# Altium integrated library Weidmueller_OMNIMATE_Signal.IntLib: 2550 symbols (part 22 of 45) (continued)
## 1793150000_Single (continued)
OMNIMATE Signal - series BC/SC 3.81; PartNumber: 1793150000; Manufacturer: Weidmueller; Short_text_for_material: SC 3.81/04/90G 3.2SN BK BX; Side_termination_characteristic: closed side; Mounting_onto_the_PCB: Solder connection; Pitch_mm: 3.81 mm; Pitch_inch: 0.15 inch; No_of_poles: 4; Outgoing_elbow: 90°; Solder_pin_length_mm: 3.2 mm; Contact_surface: tinned; Insulating_material: PA GF; UL_94_flammability_rating: V-0; Rated_voltage_for_surge_voltage_class_pollution_degree_II_2: 320 V; Rated_current_min_no_of_poles_TU_20_deg_C: 17.5 A; Rated_voltage_use_group_B_UL_1059: 300 V; Rated_current_use_group_B_UL_1059: 10 A; PackageReference: SC_3_81_90G_04; Colour: Black; Packaging: Box; Qty: 50 PCS; Revision: V1; ComponentLink1Description: Manufacturer URL; ComponentLink1URL: http://www.weidmueller.com/; ComponentLink2Description: URL Link1; ComponentLink2URL: http://catalog.weidmueller.com/catalog/Start.do?localeId=en&ObjectID=1793150000
footprint SC_3_81_90G_04 (OMNIMATE Signal - Serie BC/SC 3.81  SC 3.81/04/90G 3.2)
part A pins: A1
part B pins: A2
part C pins: A3
part D pins: A4

## 1793180000
designator J?
OMNIMATE Signal - series BC/SC 3.81; PartNumber: 1793180000; Manufacturer: Weidmueller; Short_text_for_material: SC 3.81/08/90G 3.2SN BK BX; Side_termination_characteristic: closed side; Mounting_onto_the_PCB: Solder connection; Pitch_mm: 3.81 mm; Pitch_inch: 0.15 inch; No_of_poles: 8; Outgoing_elbow: 90°; Solder_pin_length_mm: 3.2 mm; Contact_surface: tinned; Insulating_material: PA GF; UL_94_flammability_rating: V-0; Rated_voltage_for_surge_voltage_class_pollution_degree_II_2: 320 V; Rated_current_min_no_of_poles_TU_20_deg_C: 17.5 A; Rated_voltage_use_group_B_UL_1059: 300 V; Rated_current_use_group_B_UL_1059: 10 A; PackageReference: SC_3_81_90G_08; Colour: Black; Packaging: Box; Qty: 50 PCS; Revision: V1; ComponentLink1Description: Manufacturer URL; ComponentLink1URL: http://www.weidmueller.com/; ComponentLink2Description: URL Link1; ComponentLink2URL: http://catalog.weidmueller.com/catalog/Start.do?localeId=en&ObjectID=1793180000
footprint SC_3_81_90G_08 (OMNIMATE Signal - Serie BC/SC 3.81  SC 3.81/08/90G 3.2)
pins: A1, A2, A3, A4, A5, A6, A7, A8

## 1793180000_Single
designator J?
OMNIMATE Signal - series BC/SC 3.81; PartNumber: 1793180000; Manufacturer: Weidmueller; Short_text_for_material: SC 3.81/08/90G 3.2SN BK BX; Side_termination_characteristic: closed side; Mounting_onto_the_PCB: Solder connection; Pitch_mm: 3.81 mm; Pitch_inch: 0.15 inch; No_of_poles: 8; Outgoing_elbow: 90°; Solder_pin_length_mm: 3.2 mm; Contact_surface: tinned; Insulating_material: PA GF; UL_94_flammability_rating: V-0; Rated_voltage_for_surge_voltage_class_pollution_degree_II_2: 320 V; Rated_current_min_no_of_poles_TU_20_deg_C: 17.5 A; Rated_voltage_use_group_B_UL_1059: 300 V; Rated_current_use_group_B_UL_1059: 10 A; PackageReference: SC_3_81_90G_08; Colour: Black; Packaging: Box; Qty: 50 PCS; Revision: V1; ComponentLink1Description: Manufacturer URL; ComponentLink1URL: http://www.weidmueller.com/; ComponentLink2Description: URL Link1; ComponentLink2URL: http://catalog.weidmueller.com/catalog/Start.do?localeId=en&ObjectID=1793180000
footprint SC_3_81_90G_08 (OMNIMATE Signal - Serie BC/SC 3.81  SC 3.81/08/90G 3.2)
part A pins: A1
part B pins: A2
part C pins: A3
part D pins: A4
part E pins: A5
part F pins: A6
part G pins: A7
part H pins: A8

## 1793330000
designator J?
OMNIMATE Signal - series BC/SC 3.81; PartNumber: 1793330000; Manufacturer: Weidmueller; Short_text_for_material: SC 3.81/02/90F 3.2SN BK BX; Side_termination_characteristic: Flange; Mounting_onto_the_PCB: Solder connection; Pitch_mm: 3.81 mm; Pitch_inch: 0.15 inch; No_of_poles: 2; Outgoing_elbow: 90°; Solder_pin_length_mm: 3.2 mm; Contact_surface: tinned; Insulating_material: PA GF; UL_94_flammability_rating: V-0; Rated_voltage_for_surge_voltage_class_pollution_degree_II_2: 320 V; Rated_current_min_no_of_poles_TU_20_deg_C: 17.5 A; Rated_voltage_use_group_B_UL_1059: 300 V; Rated_current_use_group_B_UL_1059: 10 A; PackageReference: SC_3_81_90F_02; Colour: Black; Packaging: Box; Qty: 50 PCS; Revision: V1; ComponentLink1Description: Manufacturer URL; ComponentLink1URL: http://www.weidmueller.com/; ComponentLink2Description: URL Link1; ComponentLink2URL: http://catalog.weidmueller.com/catalog/Start.do?localeId=en&ObjectID=1793330000
footprint SC_3_81_90F_02 (OMNIMATE Signal - Serie BC/SC 3.81  SC 3.81/02/90F 3.2)
pins: A1, A2

## 1793330000_Single
designator J?
OMNIMATE Signal - series BC/SC 3.81; PartNumber: 1793330000; Manufacturer: Weidmueller; Short_text_for_material: SC 3.81/02/90F 3.2SN BK BX; Side_termination_characteristic: Flange; Mounting_onto_the_PCB: Solder connection; Pitch_mm: 3.81 mm; Pitch_inch: 0.15 inch; No_of_poles: 2; Outgoing_elbow: 90°; Solder_pin_length_mm: 3.2 mm; Contact_surface: tinned; Insulating_material: PA GF; UL_94_flammability_rating: V-0; Rated_voltage_for_surge_voltage_class_pollution_degree_II_2: 320 V; Rated_current_min_no_of_poles_TU_20_deg_C: 17.5 A; Rated_voltage_use_group_B_UL_1059: 300 V; Rated_current_use_group_B_UL_1059: 10 A; PackageReference: SC_3_81_90F_02; Colour: Black; Packaging: Box; Qty: 50 PCS; Revision: V1; ComponentLink1Description: Manufacturer URL; ComponentLink1URL: http://www.weidmueller.com/; ComponentLink2Description: URL Link1; ComponentLink2URL: http://catalog.weidmueller.com/catalog/Start.do?localeId=en&ObjectID=1793330000
footprint SC_3_81_90F_02 (OMNIMATE Signal - Serie BC/SC 3.81  SC 3.81/02/90F 3.2)
part A pins: A1
part B pins: A2

## 1793340000
designator J?
OMNIMATE Signal - series BC/SC 3.81; PartNumber: 1793340000; Manufacturer: Weidmueller; Short_text_for_material: SC 3.81/03/90F 3.2SN BK BX; Side_termination_characteristic: Flange; Mounting_onto_the_PCB: Solder connection; Pitch_mm: 3.81 mm; Pitch_inch: 0.15 inch; No_of_poles: 3; Outgoing_elbow: 90°; Solder_pin_length_mm: 3.2 mm; Contact_surface: tinned; Insulating_material: PA GF; UL_94_flammability_rating: V-0; Rated_voltage_for_surge_voltage_class_pollution_degree_II_2: 320 V; Rated_current_min_no_of_poles_TU_20_deg_C: 17.5 A; Rated_voltage_use_group_B_UL_1059: 300 V; Rated_current_use_group_B_UL_1059: 10 A; PackageReference: SC_3_81_90F_03; Colour: Black; Packaging: Box; Qty: 50 PCS; Revision: V1; ComponentLink1Description: Manufacturer URL; ComponentLink1URL: http://www.weidmueller.com/; ComponentLink2Description: URL Link1; ComponentLink2URL: http://catalog.weidmueller.com/catalog/Start.do?localeId=en&ObjectID=1793340000
footprint SC_3_81_90F_03 (OMNIMATE Signal - Serie BC/SC 3.81  SC 3.81/03/90F 3.2)
pins: A1, A2, A3

## 1793340000_Single
designator J?
OMNIMATE Signal - series BC/SC 3.81; PartNumber: 1793340000; Manufacturer: Weidmueller; Short_text_for_material: SC 3.81/03/90F 3.2SN BK BX; Side_termination_characteristic: Flange; Mounting_onto_the_PCB: Solder connection; Pitch_mm: 3.81 mm; Pitch_inch: 0.15 inch; No_of_poles: 3; Outgoing_elbow: 90°; Solder_pin_length_mm: 3.2 mm; Contact_surface: tinned; Insulating_material: PA GF; UL_94_flammability_rating: V-0; Rated_voltage_for_surge_voltage_class_pollution_degree_II_2: 320 V; Rated_current_min_no_of_poles_TU_20_deg_C: 17.5 A; Rated_voltage_use_group_B_UL_1059: 300 V; Rated_current_use_group_B_UL_1059: 10 A; PackageReference: SC_3_81_90F_03; Colour: Black; Packaging: Box; Qty: 50 PCS; Revision: V1; ComponentLink1Description: Manufacturer URL; ComponentLink1URL: http://www.weidmueller.com/; ComponentLink2Description: URL Link1; ComponentLink2URL: http://catalog.weidmueller.com/catalog/Start.do?localeId=en&ObjectID=1793340000
footprint SC_3_81_90F_03 (OMNIMATE Signal - Serie BC/SC 3.81  SC 3.81/03/90F 3.2)
part A pins: A1
part B pins: A2
part C pins: A3

## 1793350000
designator J?
OMNIMATE Signal - series BC/SC 3.81; PartNumber: 1793350000; Manufacturer: Weidmueller; Short_text_for_material: SC 3.81/04/90F 3.2SN BK BX; Side_termination_characteristic: Flange; Mounting_onto_the_PCB: Solder connection; Pitch_mm: 3.81 mm; Pitch_inch: 0.15 inch; No_of_poles: 4; Outgoing_elbow: 90°; Solder_pin_length_mm: 3.2 mm; Contact_surface: tinned; Insulating_material: PA GF; UL_94_flammability_rating: V-0; Rated_voltage_for_surge_voltage_class_pollution_degree_II_2: 320 V; Rated_current_min_no_of_poles_TU_20_deg_C: 17.5 A; Rated_voltage_use_group_B_UL_1059: 300 V; Rated_current_use_group_B_UL_1059: 10 A; PackageReference: SC_3_81_90F_04; Colour: Black; Packaging: Box; Qty: 50 PCS; Revision: V1; ComponentLink1Description: Manufacturer URL; ComponentLink1URL: http://www.weidmueller.com/; ComponentLink2Description: URL Link1; ComponentLink2URL: http://catalog.weidmueller.com/catalog/Start.do?localeId=en&ObjectID=1793350000
footprint SC_3_81_90F_04 (OMNIMATE Signal - Serie BC/SC 3.81  SC 3.81/04/90F 3.2)
pins: A1, A2, A3, A4

## 1793350000_Single
designator J?
OMNIMATE Signal - series BC/SC 3.81; PartNumber: 1793350000; Manufacturer: Weidmueller; Short_text_for_material: SC 3.81/04/90F 3.2SN BK BX; Side_termination_characteristic: Flange; Mounting_onto_the_PCB: Solder connection; Pitch_mm: 3.81 mm; Pitch_inch: 0.15 inch; No_of_poles: 4; Outgoing_elbow: 90°; Solder_pin_length_mm: 3.2 mm; Contact_surface: tinned; Insulating_material: PA GF; UL_94_flammability_rating: V-0; Rated_voltage_for_surge_voltage_class_pollution_degree_II_2: 320 V; Rated_current_min_no_of_poles_TU_20_deg_C: 17.5 A; Rated_voltage_use_group_B_UL_1059: 300 V; Rated_current_use_group_B_UL_1059: 10 A; PackageReference: SC_3_81_90F_04; Colour: Black; Packaging: Box; Qty: 50 PCS; Revision: V1; ComponentLink1Description: Manufacturer URL; ComponentLink1URL: http://www.weidmueller.com/; ComponentLink2Description: URL Link1; ComponentLink2URL: http://catalog.weidmueller.com/catalog/Start.do?localeId=en&ObjectID=1793350000
footprint SC_3_81_90F_04 (OMNIMATE Signal - Serie BC/SC 3.81  SC 3.81/04/90F 3.2)
part A pins: A1
part B pins: A2
part C pins: A3
part D pins: A4

## 1793380000
designator J?
OMNIMATE Signal - series BC/SC 3.81; PartNumber: 1793380000; Manufacturer: Weidmueller; Short_text_for_material: SC 3.81/08/90F 3.2SN BK BX; Side_termination_characteristic: Flange; Mounting_onto_the_PCB: Solder connection; Pitch_mm: 3.81 mm; Pitch_inch: 0.15 inch; No_of_poles: 8; Outgoing_elbow: 90°; Solder_pin_length_mm: 3.2 mm; Contact_surface: tinned; Insulating_material: PA GF; UL_94_flammability_rating: V-0; Rated_voltage_for_surge_voltage_class_pollution_degree_II_2: 320 V; Rated_current_min_no_of_poles_TU_20_deg_C: 17.5 A; Rated_voltage_use_group_B_UL_1059: 300 V; Rated_current_use_group_B_UL_1059: 10 A; PackageReference: SC_3_81_90F_08; Colour: Black; Packaging: Box; Qty: 50 PCS; Revision: V1; ComponentLink1Description: Manufacturer URL; ComponentLink1URL: http://www.weidmueller.com/; ComponentLink2Description: URL Link1; ComponentLink2URL: http://catalog.weidmueller.com/catalog/Start.do?localeId=en&ObjectID=1793380000
footprint SC_3_81_90F_08 (OMNIMATE Signal - Serie BC/SC 3.81  SC 3.81/08/90F 3.2)
pins: A1, A2, A3, A4, A5, A6, A7, A8

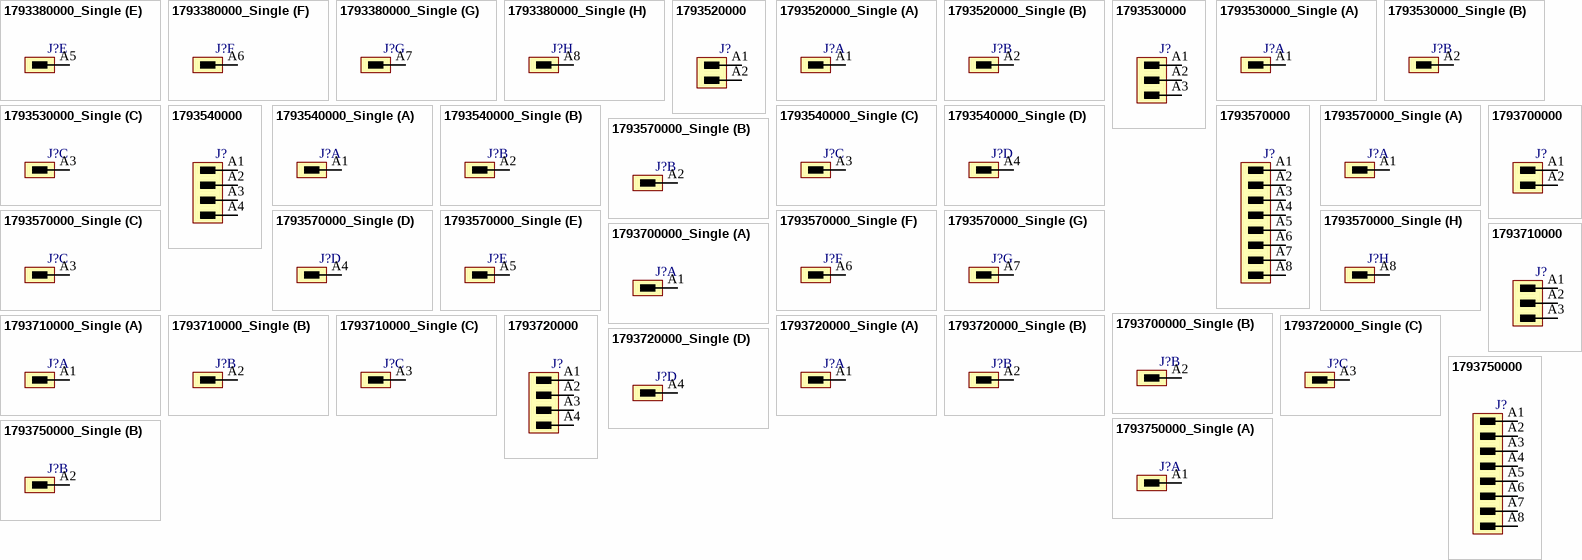
[diagram p120: symbols 1793380000_Single to 1793750000_Single]

## 1793380000_Single
designator J?
OMNIMATE Signal - series BC/SC 3.81; PartNumber: 1793380000; Manufacturer: Weidmueller; Short_text_for_material: SC 3.81/08/90F 3.2SN BK BX; Side_termination_characteristic: Flange; Mounting_onto_the_PCB: Solder connection; Pitch_mm: 3.81 mm; Pitch_inch: 0.15 inch; No_of_poles: 8; Outgoing_elbow: 90°; Solder_pin_length_mm: 3.2 mm; Contact_surface: tinned; Insulating_material: PA GF; UL_94_flammability_rating: V-0; Rated_voltage_for_surge_voltage_class_pollution_degree_II_2: 320 V; Rated_current_min_no_of_poles_TU_20_deg_C: 17.5 A; Rated_voltage_use_group_B_UL_1059: 300 V; Rated_current_use_group_B_UL_1059: 10 A; PackageReference: SC_3_81_90F_08; Colour: Black; Packaging: Box; Qty: 50 PCS; Revision: V1; ComponentLink1Description: Manufacturer URL; ComponentLink1URL: http://www.weidmueller.com/; ComponentLink2Description: URL Link1; ComponentLink2URL: http://catalog.weidmueller.com/catalog/Start.do?localeId=en&ObjectID=1793380000
footprint SC_3_81_90F_08 (OMNIMATE Signal - Serie BC/SC 3.81  SC 3.81/08/90F 3.2)
part A pins: A1
part B pins: A2
part C pins: A3
part D pins: A4
part E pins: A5
part F pins: A6
part G pins: A7
part H pins: A8

## 1793520000
designator J?
OMNIMATE Signal - series BC/SC 3.81; PartNumber: 1793520000; Manufacturer: Weidmueller; Short_text_for_material: SC 3.81/02/180G 3.2SN BK BX; Side_termination_characteristic: closed side; Mounting_onto_the_PCB: Solder connection; Pitch_mm: 3.81 mm; Pitch_inch: 0.15 inch; No_of_poles: 2; Outgoing_elbow: 180°; Solder_pin_length_mm: 3.2 mm; Contact_surface: tinned; Insulating_material: PA GF; UL_94_flammability_rating: V-0; Rated_voltage_for_surge_voltage_class_pollution_degree_II_2: 320 V; Rated_current_min_no_of_poles_TU_20_deg_C: 17.5 A; Rated_voltage_use_group_B_UL_1059: 300 V; Rated_current_use_group_B_UL_1059: 10 A; PackageReference: SC_3_81_180G_02; Colour: Black; Packaging: Box; Qty: 50 PCS; Revision: V1; ComponentLink1Description: Manufacturer URL; ComponentLink1URL: http://www.weidmueller.com/; ComponentLink2Description: URL Link1; ComponentLink2URL: http://catalog.weidmueller.com/catalog/Start.do?localeId=en&ObjectID=1793520000
footprint SC_3_81_180G_02 (OMNIMATE Signal - Serie BC/SC 3.81  SC 3.81/02/180G 3.2)
pins: A1, A2

## 1793520000_Single
designator J?
OMNIMATE Signal - series BC/SC 3.81; PartNumber: 1793520000; Manufacturer: Weidmueller; Short_text_for_material: SC 3.81/02/180G 3.2SN BK BX; Side_termination_characteristic: closed side; Mounting_onto_the_PCB: Solder connection; Pitch_mm: 3.81 mm; Pitch_inch: 0.15 inch; No_of_poles: 2; Outgoing_elbow: 180°; Solder_pin_length_mm: 3.2 mm; Contact_surface: tinned; Insulating_material: PA GF; UL_94_flammability_rating: V-0; Rated_voltage_for_surge_voltage_class_pollution_degree_II_2: 320 V; Rated_current_min_no_of_poles_TU_20_deg_C: 17.5 A; Rated_voltage_use_group_B_UL_1059: 300 V; Rated_current_use_group_B_UL_1059: 10 A; PackageReference: SC_3_81_180G_02; Colour: Black; Packaging: Box; Qty: 50 PCS; Revision: V1; ComponentLink1Description: Manufacturer URL; ComponentLink1URL: http://www.weidmueller.com/; ComponentLink2Description: URL Link1; ComponentLink2URL: http://catalog.weidmueller.com/catalog/Start.do?localeId=en&ObjectID=1793520000
footprint SC_3_81_180G_02 (OMNIMATE Signal - Serie BC/SC 3.81  SC 3.81/02/180G 3.2)
part A pins: A1
part B pins: A2

## 1793530000
designator J?
OMNIMATE Signal - series BC/SC 3.81; PartNumber: 1793530000; Manufacturer: Weidmueller; Short_text_for_material: SC 3.81/03/180G 3.2SN BK BX; Side_termination_characteristic: closed side; Mounting_onto_the_PCB: Solder connection; Pitch_mm: 3.81 mm; Pitch_inch: 0.15 inch; No_of_poles: 3; Outgoing_elbow: 180°; Solder_pin_length_mm: 3.2 mm; Contact_surface: tinned; Insulating_material: PA GF; UL_94_flammability_rating: V-0; Rated_voltage_for_surge_voltage_class_pollution_degree_II_2: 320 V; Rated_current_min_no_of_poles_TU_20_deg_C: 17.5 A; Rated_voltage_use_group_B_UL_1059: 300 V; Rated_current_use_group_B_UL_1059: 10 A; PackageReference: SC_3_81_180G_03; Colour: Black; Packaging: Box; Qty: 50 PCS; Revision: V1; ComponentLink1Description: Manufacturer URL; ComponentLink1URL: http://www.weidmueller.com/; ComponentLink2Description: URL Link1; ComponentLink2URL: http://catalog.weidmueller.com/catalog/Start.do?localeId=en&ObjectID=1793530000
footprint SC_3_81_180G_03 (OMNIMATE Signal - Serie BC/SC 3.81  SC 3.81/03/180G 3.2)
pins: A1, A2, A3

## 1793530000_Single
designator J?
OMNIMATE Signal - series BC/SC 3.81; PartNumber: 1793530000; Manufacturer: Weidmueller; Short_text_for_material: SC 3.81/03/180G 3.2SN BK BX; Side_termination_characteristic: closed side; Mounting_onto_the_PCB: Solder connection; Pitch_mm: 3.81 mm; Pitch_inch: 0.15 inch; No_of_poles: 3; Outgoing_elbow: 180°; Solder_pin_length_mm: 3.2 mm; Contact_surface: tinned; Insulating_material: PA GF; UL_94_flammability_rating: V-0; Rated_voltage_for_surge_voltage_class_pollution_degree_II_2: 320 V; Rated_current_min_no_of_poles_TU_20_deg_C: 17.5 A; Rated_voltage_use_group_B_UL_1059: 300 V; Rated_current_use_group_B_UL_1059: 10 A; PackageReference: SC_3_81_180G_03; Colour: Black; Packaging: Box; Qty: 50 PCS; Revision: V1; ComponentLink1Description: Manufacturer URL; ComponentLink1URL: http://www.weidmueller.com/; ComponentLink2Description: URL Link1; ComponentLink2URL: http://catalog.weidmueller.com/catalog/Start.do?localeId=en&ObjectID=1793530000
footprint SC_3_81_180G_03 (OMNIMATE Signal - Serie BC/SC 3.81  SC 3.81/03/180G 3.2)
part A pins: A1
part B pins: A2
part C pins: A3

## 1793540000
designator J?
OMNIMATE Signal - series BC/SC 3.81; PartNumber: 1793540000; Manufacturer: Weidmueller; Short_text_for_material: SC 3.81/04/180G 3.2SN BK BX; Side_termination_characteristic: closed side; Mounting_onto_the_PCB: Solder connection; Pitch_mm: 3.81 mm; Pitch_inch: 0.15 inch; No_of_poles: 4; Outgoing_elbow: 180°; Solder_pin_length_mm: 3.2 mm; Contact_surface: tinned; Insulating_material: PA GF; UL_94_flammability_rating: V-0; Rated_voltage_for_surge_voltage_class_pollution_degree_II_2: 320 V; Rated_current_min_no_of_poles_TU_20_deg_C: 17.5 A; Rated_voltage_use_group_B_UL_1059: 300 V; Rated_current_use_group_B_UL_1059: 10 A; PackageReference: SC_3_81_180G_04; Colour: Black; Packaging: Box; Qty: 50 PCS; Revision: V1; ComponentLink1Description: Manufacturer URL; ComponentLink1URL: http://www.weidmueller.com/; ComponentLink2Description: URL Link1; ComponentLink2URL: http://catalog.weidmueller.com/catalog/Start.do?localeId=en&ObjectID=1793540000
footprint SC_3_81_180G_04 (OMNIMATE Signal - Serie BC/SC 3.81  SC 3.81/04/180G 3.2)
pins: A1, A2, A3, A4

## 1793540000_Single
designator J?
OMNIMATE Signal - series BC/SC 3.81; PartNumber: 1793540000; Manufacturer: Weidmueller; Short_text_for_material: SC 3.81/04/180G 3.2SN BK BX; Side_termination_characteristic: closed side; Mounting_onto_the_PCB: Solder connection; Pitch_mm: 3.81 mm; Pitch_inch: 0.15 inch; No_of_poles: 4; Outgoing_elbow: 180°; Solder_pin_length_mm: 3.2 mm; Contact_surface: tinned; Insulating_material: PA GF; UL_94_flammability_rating: V-0; Rated_voltage_for_surge_voltage_class_pollution_degree_II_2: 320 V; Rated_current_min_no_of_poles_TU_20_deg_C: 17.5 A; Rated_voltage_use_group_B_UL_1059: 300 V; Rated_current_use_group_B_UL_1059: 10 A; PackageReference: SC_3_81_180G_04; Colour: Black; Packaging: Box; Qty: 50 PCS; Revision: V1; ComponentLink1Description: Manufacturer URL; ComponentLink1URL: http://www.weidmueller.com/; ComponentLink2Description: URL Link1; ComponentLink2URL: http://catalog.weidmueller.com/catalog/Start.do?localeId=en&ObjectID=1793540000
footprint SC_3_81_180G_04 (OMNIMATE Signal - Serie BC/SC 3.81  SC 3.81/04/180G 3.2)
part A pins: A1
part B pins: A2
part C pins: A3
part D pins: A4

## 1793570000
designator J?
OMNIMATE Signal - series BC/SC 3.81; PartNumber: 1793570000; Manufacturer: Weidmueller; Short_text_for_material: SC 3.81/08/180G 3.2SN BK BX; Side_termination_characteristic: closed side; Mounting_onto_the_PCB: Solder connection; Pitch_mm: 3.81 mm; Pitch_inch: 0.15 inch; No_of_poles: 8; Outgoing_elbow: 180°; Solder_pin_length_mm: 3.2 mm; Contact_surface: tinned; Insulating_material: PA GF; UL_94_flammability_rating: V-0; Rated_voltage_for_surge_voltage_class_pollution_degree_II_2: 320 V; Rated_current_min_no_of_poles_TU_20_deg_C: 17.5 A; Rated_voltage_use_group_B_UL_1059: 300 V; Rated_current_use_group_B_UL_1059: 10 A; PackageReference: SC_3_81_180G_08; Colour: Black; Packaging: Box; Qty: 50 PCS; Revision: V1; ComponentLink1Description: Manufacturer URL; ComponentLink1URL: http://www.weidmueller.com/; ComponentLink2Description: URL Link1; ComponentLink2URL: http://catalog.weidmueller.com/catalog/Start.do?localeId=en&ObjectID=1793570000
footprint SC_3_81_180G_08 (OMNIMATE Signal - Serie BC/SC 3.81  SC 3.81/08/180G 3.2)
pins: A1, A2, A3, A4, A5, A6, A7, A8

## 1793570000_Single
designator J?
OMNIMATE Signal - series BC/SC 3.81; PartNumber: 1793570000; Manufacturer: Weidmueller; Short_text_for_material: SC 3.81/08/180G 3.2SN BK BX; Side_termination_characteristic: closed side; Mounting_onto_the_PCB: Solder connection; Pitch_mm: 3.81 mm; Pitch_inch: 0.15 inch; No_of_poles: 8; Outgoing_elbow: 180°; Solder_pin_length_mm: 3.2 mm; Contact_surface: tinned; Insulating_material: PA GF; UL_94_flammability_rating: V-0; Rated_voltage_for_surge_voltage_class_pollution_degree_II_2: 320 V; Rated_current_min_no_of_poles_TU_20_deg_C: 17.5 A; Rated_voltage_use_group_B_UL_1059: 300 V; Rated_current_use_group_B_UL_1059: 10 A; PackageReference: SC_3_81_180G_08; Colour: Black; Packaging: Box; Qty: 50 PCS; Revision: V1; ComponentLink1Description: Manufacturer URL; ComponentLink1URL: http://www.weidmueller.com/; ComponentLink2Description: URL Link1; ComponentLink2URL: http://catalog.weidmueller.com/catalog/Start.do?localeId=en&ObjectID=1793570000
footprint SC_3_81_180G_08 (OMNIMATE Signal - Serie BC/SC 3.81  SC 3.81/08/180G 3.2)
part A pins: A1
part B pins: A2
part C pins: A3
part D pins: A4
part E pins: A5
part F pins: A6
part G pins: A7
part H pins: A8

## 1793700000
designator J?
OMNIMATE Signal - series BC/SC 3.81; PartNumber: 1793700000; Manufacturer: Weidmueller; Short_text_for_material: SC 3.81/02/180F 3.2SN BK BX; Side_termination_characteristic: Flange; Mounting_onto_the_PCB: Solder connection; Pitch_mm: 3.81 mm; Pitch_inch: 0.15 inch; No_of_poles: 2; Outgoing_elbow: 180°; Solder_pin_length_mm: 3.2 mm; Contact_surface: tinned; Insulating_material: PA GF; UL_94_flammability_rating: V-0; Rated_voltage_for_surge_voltage_class_pollution_degree_II_2: 320 V; Rated_current_min_no_of_poles_TU_20_deg_C: 17.5 A; Rated_voltage_use_group_B_UL_1059: 300 V; Rated_current_use_group_B_UL_1059: 10 A; PackageReference: SC_3_81_180F_02; Colour: Black; Packaging: Box; Qty: 50 PCS; Revision: V1; ComponentLink1Description: Manufacturer URL; ComponentLink1URL: http://www.weidmueller.com/; ComponentLink2Description: URL Link1; ComponentLink2URL: http://catalog.weidmueller.com/catalog/Start.do?localeId=en&ObjectID=1793700000
footprint SC_3_81_180F_02 (OMNIMATE Signal - Serie BC/SC 3.81  SC 3.81/02/180F 3.2)
pins: A1, A2

## 1793700000_Single
designator J?
OMNIMATE Signal - series BC/SC 3.81; PartNumber: 1793700000; Manufacturer: Weidmueller; Short_text_for_material: SC 3.81/02/180F 3.2SN BK BX; Side_termination_characteristic: Flange; Mounting_onto_the_PCB: Solder connection; Pitch_mm: 3.81 mm; Pitch_inch: 0.15 inch; No_of_poles: 2; Outgoing_elbow: 180°; Solder_pin_length_mm: 3.2 mm; Contact_surface: tinned; Insulating_material: PA GF; UL_94_flammability_rating: V-0; Rated_voltage_for_surge_voltage_class_pollution_degree_II_2: 320 V; Rated_current_min_no_of_poles_TU_20_deg_C: 17.5 A; Rated_voltage_use_group_B_UL_1059: 300 V; Rated_current_use_group_B_UL_1059: 10 A; PackageReference: SC_3_81_180F_02; Colour: Black; Packaging: Box; Qty: 50 PCS; Revision: V1; ComponentLink1Description: Manufacturer URL; ComponentLink1URL: http://www.weidmueller.com/; ComponentLink2Description: URL Link1; ComponentLink2URL: http://catalog.weidmueller.com/catalog/Start.do?localeId=en&ObjectID=1793700000
footprint SC_3_81_180F_02 (OMNIMATE Signal - Serie BC/SC 3.81  SC 3.81/02/180F 3.2)
part A pins: A1
part B pins: A2

## 1793710000
designator J?
OMNIMATE Signal - series BC/SC 3.81; PartNumber: 1793710000; Manufacturer: Weidmueller; Short_text_for_material: SC 3.81/03/180F 3.2SN BK BX; Side_termination_characteristic: Flange; Mounting_onto_the_PCB: Solder connection; Pitch_mm: 3.81 mm; Pitch_inch: 0.15 inch; No_of_poles: 3; Outgoing_elbow: 180°; Solder_pin_length_mm: 3.2 mm; Contact_surface: tinned; Insulating_material: PA GF; UL_94_flammability_rating: V-0; Rated_voltage_for_surge_voltage_class_pollution_degree_II_2: 320 V; Rated_current_min_no_of_poles_TU_20_deg_C: 17.5 A; Rated_voltage_use_group_B_UL_1059: 300 V; Rated_current_use_group_B_UL_1059: 10 A; PackageReference: SC_3_81_180F_03; Colour: Black; Packaging: Box; Qty: 50 PCS; Revision: V1; ComponentLink1Description: Manufacturer URL; ComponentLink1URL: http://www.weidmueller.com/; ComponentLink2Description: URL Link1; ComponentLink2URL: http://catalog.weidmueller.com/catalog/Start.do?localeId=en&ObjectID=1793710000
footprint SC_3_81_180F_03 (OMNIMATE Signal - Serie BC/SC 3.81  SC 3.81/03/180F 3.2)
pins: A1, A2, A3

## 1793710000_Single
designator J?
OMNIMATE Signal - series BC/SC 3.81; PartNumber: 1793710000; Manufacturer: Weidmueller; Short_text_for_material: SC 3.81/03/180F 3.2SN BK BX; Side_termination_characteristic: Flange; Mounting_onto_the_PCB: Solder connection; Pitch_mm: 3.81 mm; Pitch_inch: 0.15 inch; No_of_poles: 3; Outgoing_elbow: 180°; Solder_pin_length_mm: 3.2 mm; Contact_surface: tinned; Insulating_material: PA GF; UL_94_flammability_rating: V-0; Rated_voltage_for_surge_voltage_class_pollution_degree_II_2: 320 V; Rated_current_min_no_of_poles_TU_20_deg_C: 17.5 A; Rated_voltage_use_group_B_UL_1059: 300 V; Rated_current_use_group_B_UL_1059: 10 A; PackageReference: SC_3_81_180F_03; Colour: Black; Packaging: Box; Qty: 50 PCS; Revision: V1; ComponentLink1Description: Manufacturer URL; ComponentLink1URL: http://www.weidmueller.com/; ComponentLink2Description: URL Link1; ComponentLink2URL: http://catalog.weidmueller.com/catalog/Start.do?localeId=en&ObjectID=1793710000
footprint SC_3_81_180F_03 (OMNIMATE Signal - Serie BC/SC 3.81  SC 3.81/03/180F 3.2)
part A pins: A1
part B pins: A2
part C pins: A3

## 1793720000
designator J?
OMNIMATE Signal - series BC/SC 3.81; PartNumber: 1793720000; Manufacturer: Weidmueller; Short_text_for_material: SC 3.81/04/180F 3.2SN BK BX; Side_termination_characteristic: Flange; Mounting_onto_the_PCB: Solder connection; Pitch_mm: 3.81 mm; Pitch_inch: 0.15 inch; No_of_poles: 4; Outgoing_elbow: 180°; Solder_pin_length_mm: 3.2 mm; Contact_surface: tinned; Insulating_material: PA GF; UL_94_flammability_rating: V-0; Rated_voltage_for_surge_voltage_class_pollution_degree_II_2: 320 V; Rated_current_min_no_of_poles_TU_20_deg_C: 17.5 A; Rated_voltage_use_group_B_UL_1059: 300 V; Rated_current_use_group_B_UL_1059: 10 A; PackageReference: SC_3_81_180F_04; Colour: Black; Packaging: Box; Qty: 50 PCS; Revision: V1; ComponentLink1Description: Manufacturer URL; ComponentLink1URL: http://www.weidmueller.com/; ComponentLink2Description: URL Link1; ComponentLink2URL: http://catalog.weidmueller.com/catalog/Start.do?localeId=en&ObjectID=1793720000
footprint SC_3_81_180F_04 (OMNIMATE Signal - Serie BC/SC 3.81  SC 3.81/04/180F 3.2)
pins: A1, A2, A3, A4

## 1793720000_Single
designator J?
OMNIMATE Signal - series BC/SC 3.81; PartNumber: 1793720000; Manufacturer: Weidmueller; Short_text_for_material: SC 3.81/04/180F 3.2SN BK BX; Side_termination_characteristic: Flange; Mounting_onto_the_PCB: Solder connection; Pitch_mm: 3.81 mm; Pitch_inch: 0.15 inch; No_of_poles: 4; Outgoing_elbow: 180°; Solder_pin_length_mm: 3.2 mm; Contact_surface: tinned; Insulating_material: PA GF; UL_94_flammability_rating: V-0; Rated_voltage_for_surge_voltage_class_pollution_degree_II_2: 320 V; Rated_current_min_no_of_poles_TU_20_deg_C: 17.5 A; Rated_voltage_use_group_B_UL_1059: 300 V; Rated_current_use_group_B_UL_1059: 10 A; PackageReference: SC_3_81_180F_04; Colour: Black; Packaging: Box; Qty: 50 PCS; Revision: V1; ComponentLink1Description: Manufacturer URL; ComponentLink1URL: http://www.weidmueller.com/; ComponentLink2Description: URL Link1; ComponentLink2URL: http://catalog.weidmueller.com/catalog/Start.do?localeId=en&ObjectID=1793720000
footprint SC_3_81_180F_04 (OMNIMATE Signal - Serie BC/SC 3.81  SC 3.81/04/180F 3.2)
part A pins: A1
part B pins: A2
part C pins: A3
part D pins: A4

## 1793750000
designator J?
OMNIMATE Signal - series BC/SC 3.81; PartNumber: 1793750000; Manufacturer: Weidmueller; Short_text_for_material: SC 3.81/08/180F 3.2SN BK BX; Side_termination_characteristic: Flange; Mounting_onto_the_PCB: Solder connection; Pitch_mm: 3.81 mm; Pitch_inch: 0.15 inch; No_of_poles: 8; Outgoing_elbow: 180°; Solder_pin_length_mm: 3.2 mm; Contact_surface: tinned; Insulating_material: PA GF; UL_94_flammability_rating: V-0; Rated_voltage_for_surge_voltage_class_pollution_degree_II_2: 320 V; Rated_current_min_no_of_poles_TU_20_deg_C: 17.5 A; Rated_voltage_use_group_B_UL_1059: 300 V; Rated_current_use_group_B_UL_1059: 10 A; PackageReference: SC_3_81_180F_08; Colour: Black; Packaging: Box; Qty: 50 PCS; Revision: V1; ComponentLink1Description: Manufacturer URL; ComponentLink1URL: http://www.weidmueller.com/; ComponentLink2Description: URL Link1; ComponentLink2URL: http://catalog.weidmueller.com/catalog/Start.do?localeId=en&ObjectID=1793750000
footprint SC_3_81_180F_08 (OMNIMATE Signal - Serie BC/SC 3.81  SC 3.81/08/180F 3.2)
pins: A1, A2, A3, A4, A5, A6, A7, A8

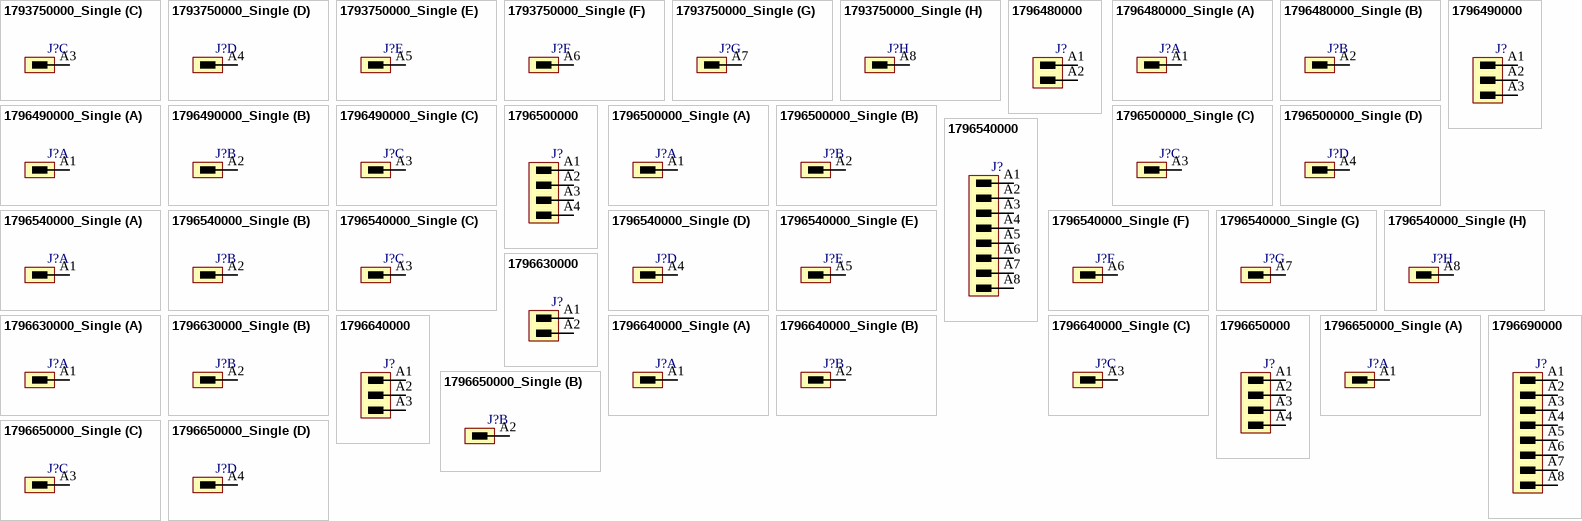
[diagram p121: symbols 1793750000_Single to 1796690000]

## 1793750000_Single
designator J?
OMNIMATE Signal - series BC/SC 3.81; PartNumber: 1793750000; Manufacturer: Weidmueller; Short_text_for_material: SC 3.81/08/180F 3.2SN BK BX; Side_termination_characteristic: Flange; Mounting_onto_the_PCB: Solder connection; Pitch_mm: 3.81 mm; Pitch_inch: 0.15 inch; No_of_poles: 8; Outgoing_elbow: 180°; Solder_pin_length_mm: 3.2 mm; Contact_surface: tinned; Insulating_material: PA GF; UL_94_flammability_rating: V-0; Rated_voltage_for_surge_voltage_class_pollution_degree_II_2: 320 V; Rated_current_min_no_of_poles_TU_20_deg_C: 17.5 A; Rated_voltage_use_group_B_UL_1059: 300 V; Rated_current_use_group_B_UL_1059: 10 A; PackageReference: SC_3_81_180F_08; Colour: Black; Packaging: Box; Qty: 50 PCS; Revision: V1; ComponentLink1Description: Manufacturer URL; ComponentLink1URL: http://www.weidmueller.com/; ComponentLink2Description: URL Link1; ComponentLink2URL: http://catalog.weidmueller.com/catalog/Start.do?localeId=en&ObjectID=1793750000
footprint SC_3_81_180F_08 (OMNIMATE Signal - Serie BC/SC 3.81  SC 3.81/08/180F 3.2)
part A pins: A1
part B pins: A2
part C pins: A3
part D pins: A4
part E pins: A5
part F pins: A6
part G pins: A7
part H pins: A8

## 1796480000
designator J?
OMNIMATE Signal - series BL/SL 5.00; PartNumber: 1796480000; Manufacturer: Weidmueller; Short_text_for_material: SL-SMT 5.00/02/180 1.5SN BK BX; Side_termination_characteristic: open side; Mounting_onto_the_PCB: Reflow solder connection; Pitch_mm: 5 mm; Pitch_inch: 0.197 inch; No_of_poles: 2; Outgoing_elbow: 180°; Solder_pin_length_mm: 1.5 mm; Contact_surface: tinned; Insulating_material: LCP GF; UL_94_flammability_rating: V-0; Rated_voltage_for_surge_voltage_class_pollution_degree_II_2: 400 V; Rated_current_min_no_of_poles_TU_20_deg_C: 19 A; Rated_voltage_use_group_B_UL_1059: 300 V; Rated_current_use_group_B_UL_1059: 15 A; PackageReference: SL_SMT_5_00_180_02; Colour: Black; Packaging: Box; Qty: 100 PCS; Revision: V1; ComponentLink1Description: Manufacturer URL; ComponentLink1URL: http://www.weidmueller.com/; ComponentLink2Description: URL Link1; ComponentLink2URL: http://catalog.weidmueller.com/catalog/Start.do?localeId=en&ObjectID=1796480000
footprint SL_SMT_5_00_180_02 (OMNIMATE Signal - Serie BL/SL 5.00  SL-SMT 5.00/02/180 3.2)
pins: A1, A2

## 1796480000_Single
designator J?
OMNIMATE Signal - series BL/SL 5.00; PartNumber: 1796480000; Manufacturer: Weidmueller; Short_text_for_material: SL-SMT 5.00/02/180 1.5SN BK BX; Side_termination_characteristic: open side; Mounting_onto_the_PCB: Reflow solder connection; Pitch_mm: 5 mm; Pitch_inch: 0.197 inch; No_of_poles: 2; Outgoing_elbow: 180°; Solder_pin_length_mm: 1.5 mm; Contact_surface: tinned; Insulating_material: LCP GF; UL_94_flammability_rating: V-0; Rated_voltage_for_surge_voltage_class_pollution_degree_II_2: 400 V; Rated_current_min_no_of_poles_TU_20_deg_C: 19 A; Rated_voltage_use_group_B_UL_1059: 300 V; Rated_current_use_group_B_UL_1059: 15 A; PackageReference: SL_SMT_5_00_180_02; Colour: Black; Packaging: Box; Qty: 100 PCS; Revision: V1; ComponentLink1Description: Manufacturer URL; ComponentLink1URL: http://www.weidmueller.com/; ComponentLink2Description: URL Link1; ComponentLink2URL: http://catalog.weidmueller.com/catalog/Start.do?localeId=en&ObjectID=1796480000
footprint SL_SMT_5_00_180_02 (OMNIMATE Signal - Serie BL/SL 5.00  SL-SMT 5.00/02/180 3.2)
part A pins: A1
part B pins: A2

## 1796490000
designator J?
OMNIMATE Signal - series BL/SL 5.00; PartNumber: 1796490000; Manufacturer: Weidmueller; Short_text_for_material: SL-SMT 5.00/03/180 1.5SN BK BX; Side_termination_characteristic: open side; Mounting_onto_the_PCB: Reflow solder connection; Pitch_mm: 5 mm; Pitch_inch: 0.197 inch; No_of_poles: 3; Outgoing_elbow: 180°; Solder_pin_length_mm: 1.5 mm; Contact_surface: tinned; Insulating_material: LCP GF; UL_94_flammability_rating: V-0; Rated_voltage_for_surge_voltage_class_pollution_degree_II_2: 400 V; Rated_current_min_no_of_poles_TU_20_deg_C: 19 A; Rated_voltage_use_group_B_UL_1059: 300 V; Rated_current_use_group_B_UL_1059: 15 A; PackageReference: SL_SMT_5_00_180_03; Colour: Black; Packaging: Box; Qty: 100 PCS; Revision: V1; ComponentLink1Description: Manufacturer URL; ComponentLink1URL: http://www.weidmueller.com/; ComponentLink2Description: URL Link1; ComponentLink2URL: http://catalog.weidmueller.com/catalog/Start.do?localeId=en&ObjectID=1796490000
footprint SL_SMT_5_00_180_03 (OMNIMATE Signal - Serie BL/SL 5.00  SL-SMT 5.00/03/180 3.2)
pins: A1, A2, A3

## 1796490000_Single
designator J?
OMNIMATE Signal - series BL/SL 5.00; PartNumber: 1796490000; Manufacturer: Weidmueller; Short_text_for_material: SL-SMT 5.00/03/180 1.5SN BK BX; Side_termination_characteristic: open side; Mounting_onto_the_PCB: Reflow solder connection; Pitch_mm: 5 mm; Pitch_inch: 0.197 inch; No_of_poles: 3; Outgoing_elbow: 180°; Solder_pin_length_mm: 1.5 mm; Contact_surface: tinned; Insulating_material: LCP GF; UL_94_flammability_rating: V-0; Rated_voltage_for_surge_voltage_class_pollution_degree_II_2: 400 V; Rated_current_min_no_of_poles_TU_20_deg_C: 19 A; Rated_voltage_use_group_B_UL_1059: 300 V; Rated_current_use_group_B_UL_1059: 15 A; PackageReference: SL_SMT_5_00_180_03; Colour: Black; Packaging: Box; Qty: 100 PCS; Revision: V1; ComponentLink1Description: Manufacturer URL; ComponentLink1URL: http://www.weidmueller.com/; ComponentLink2Description: URL Link1; ComponentLink2URL: http://catalog.weidmueller.com/catalog/Start.do?localeId=en&ObjectID=1796490000
footprint SL_SMT_5_00_180_03 (OMNIMATE Signal - Serie BL/SL 5.00  SL-SMT 5.00/03/180 3.2)
part A pins: A1
part B pins: A2
part C pins: A3

## 1796500000
designator J?
OMNIMATE Signal - series BL/SL 5.00; PartNumber: 1796500000; Manufacturer: Weidmueller; Short_text_for_material: SL-SMT 5.00/04/180 1.5SN BK BX; Side_termination_characteristic: open side; Mounting_onto_the_PCB: Reflow solder connection; Pitch_mm: 5 mm; Pitch_inch: 0.197 inch; No_of_poles: 4; Outgoing_elbow: 180°; Solder_pin_length_mm: 1.5 mm; Contact_surface: tinned; Insulating_material: LCP GF; UL_94_flammability_rating: V-0; Rated_voltage_for_surge_voltage_class_pollution_degree_II_2: 400 V; Rated_current_min_no_of_poles_TU_20_deg_C: 19 A; Rated_voltage_use_group_B_UL_1059: 300 V; Rated_current_use_group_B_UL_1059: 15 A; PackageReference: SL_SMT_5_00_180_04; Colour: Black; Packaging: Box; Qty: 100 PCS; Revision: V1; ComponentLink1Description: Manufacturer URL; ComponentLink1URL: http://www.weidmueller.com/; ComponentLink2Description: URL Link1; ComponentLink2URL: http://catalog.weidmueller.com/catalog/Start.do?localeId=en&ObjectID=1796500000
footprint SL_SMT_5_00_180_04 (OMNIMATE Signal - Serie BL/SL 5.00  SL-SMT 5.00/04/180 3.2)
pins: A1, A2, A3, A4

## 1796500000_Single
designator J?
OMNIMATE Signal - series BL/SL 5.00; PartNumber: 1796500000; Manufacturer: Weidmueller; Short_text_for_material: SL-SMT 5.00/04/180 1.5SN BK BX; Side_termination_characteristic: open side; Mounting_onto_the_PCB: Reflow solder connection; Pitch_mm: 5 mm; Pitch_inch: 0.197 inch; No_of_poles: 4; Outgoing_elbow: 180°; Solder_pin_length_mm: 1.5 mm; Contact_surface: tinned; Insulating_material: LCP GF; UL_94_flammability_rating: V-0; Rated_voltage_for_surge_voltage_class_pollution_degree_II_2: 400 V; Rated_current_min_no_of_poles_TU_20_deg_C: 19 A; Rated_voltage_use_group_B_UL_1059: 300 V; Rated_current_use_group_B_UL_1059: 15 A; PackageReference: SL_SMT_5_00_180_04; Colour: Black; Packaging: Box; Qty: 100 PCS; Revision: V1; ComponentLink1Description: Manufacturer URL; ComponentLink1URL: http://www.weidmueller.com/; ComponentLink2Description: URL Link1; ComponentLink2URL: http://catalog.weidmueller.com/catalog/Start.do?localeId=en&ObjectID=1796500000
footprint SL_SMT_5_00_180_04 (OMNIMATE Signal - Serie BL/SL 5.00  SL-SMT 5.00/04/180 3.2)
part A pins: A1
part B pins: A2
part C pins: A3
part D pins: A4